# Altium footprint library SEMICONDUCTORS.PcbLib: 91 footprints (part 1 of 6)
Each footprint in its own frame and in the unit in brackets; x right, y up, seen from the top. Pads: shape width x height; smd on the part's side, far side on the other; paste and mask are expansions set on the pad; w line width, h text height; cw(c..) or ccw(c..) is an arc to the next point about the centre after c.
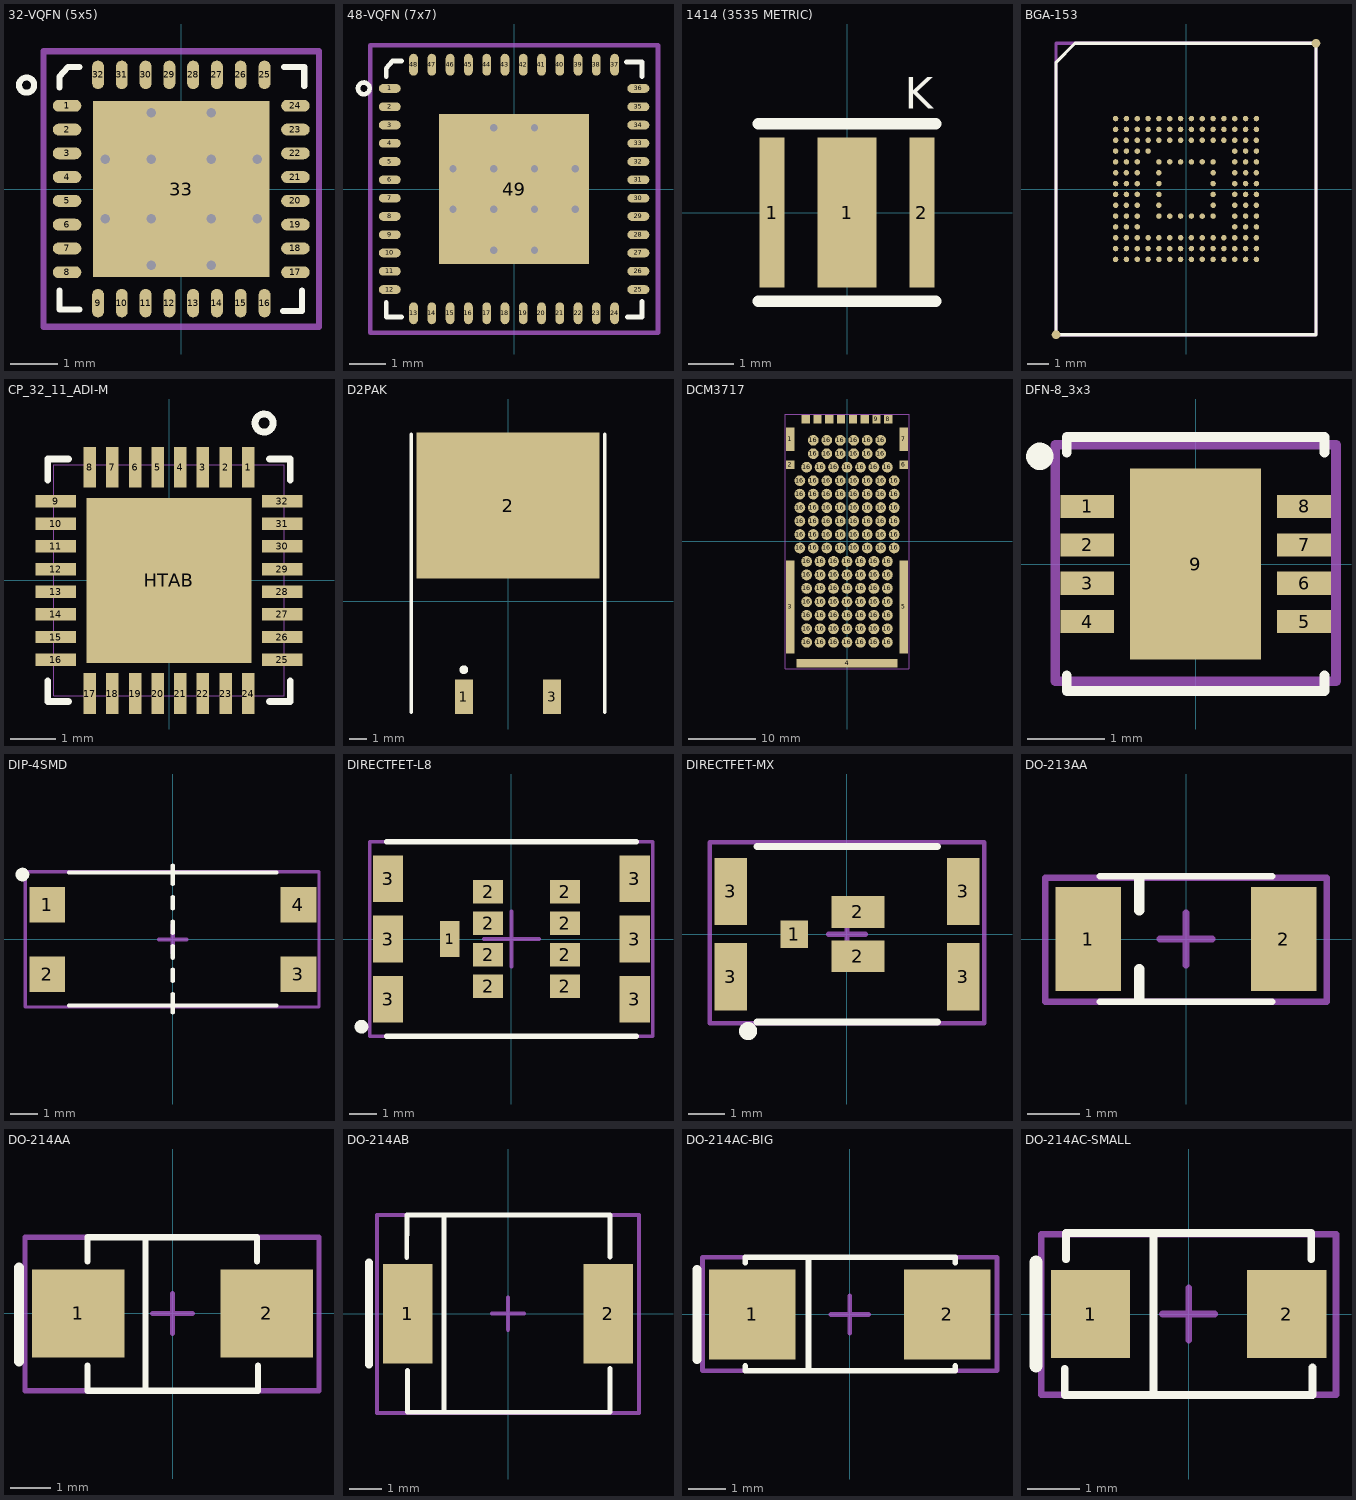
[diagram p0: the footprints below, top view; thin cyan lines are the x and y axes]

## 32-VQFN (5x5) [mm] "Stencil de espesor 5mil"
pads (33):
  oval 0.6x0.25 smd: 1(-2.4,1.75) 2(-2.4,1.25) 3(-2.4,0.75) 4(-2.4,0.25) 5(-2.4,-0.25) 6(-2.4,-0.75) 7(-2.4,-1.25) 8(-2.4,-1.75) 17(2.4,-1.75) 18(2.4,-1.25) 19(2.4,-0.75) 20(2.4,-0.25) 21(2.4,0.25) 22(2.4,0.75) 23(2.4,1.25) 24(2.4,1.75)
  oval 0.25x0.6 smd: 9(-1.75,-2.4) 10(-1.25,-2.4) 11(-0.75,-2.4) 12(-0.25,-2.4) 13(0.25,-2.4) 14(0.75,-2.4) 15(1.25,-2.4) 16(1.75,-2.4) 25(1.75,2.4) 26(1.25,2.4) 27(0.75,2.4) 28(0.25,2.4) 29(-0.25,2.4) 30(-0.75,2.4) 31(-1.25,2.4) 32(-1.75,2.4)
  rect 3.7x3.7 smd paste-1.32: 33(0,0)
via 1.6,0.63 diameter 0.3 hole 0.2
via 1.6,-0.63 diameter 0.3 hole 0.2
via -1.6,0.63 diameter 0.3 hole 0.2
via -1.6,-0.63 diameter 0.3 hole 0.2
via 0.63,-0.63 diameter 0.3 hole 0.2
via -0.63,-0.63 diameter 0.3 hole 0.2
via 0.63,0.63 diameter 0.3 hole 0.2
via -0.63,0.63 diameter 0.3 hole 0.2
via 0.63,-1.6 diameter 0.3 hole 0.2
via -0.63,-1.6 diameter 0.3 hole 0.2
via -0.63,1.6 diameter 0.3 hole 0.2
via 0.63,1.6 diameter 0.3 hole 0.2
Top Overlay:
  circle w0.127: c-3.251,2.184 r0.16
  lines w0.127: -2.56,-2.135 -2.56,-2.535 -2.135,-2.535 ; -2.56,2.135 -2.56,2.366 -2.385,2.56 -2.135,2.56 ; 2.135,-2.56 2.535,-2.56 2.535,-2.135 ; 2.161,2.561 2.586,2.561 2.586,2.161
Top Paste:
  region: 0.73,1.79 0.73,0.73 1.79,0.73 1.79,1.79
  region: 0.73,0.53 0.73,-0.53 1.79,-0.53 1.79,0.53
  region: 0.73,-0.73 0.73,-1.79 1.79,-1.79 1.79,-0.73
  region: -1.79,-0.73 -1.79,-1.79 -0.73,-1.79 -0.73,-0.73
  region: -1.79,0.53 -1.79,-0.53 -0.73,-0.53 -0.73,0.53
  region: -1.79,1.79 -1.79,0.73 -0.73,0.73 -0.73,1.79
  region: -0.53,-0.73 -0.53,-1.79 0.53,-1.79 0.53,-0.73
  region: -0.53,1.79 -0.53,0.73 0.53,0.73 0.53,1.79
Top Assembly (Mech8):
  lines w0.127: -2.896,-2.896 2.896,-2.896 2.896,2.896 -2.896,2.896 -2.896,-2.896
  text ".Designator" at -1.549,-0.381 h1.2
Top Component Center (Mech10):
  lines w0.15: -0.5,0 0.5,0 ; 0,-0.5 0,0.5
3D body "DS90UB953TRHBRQ1.STEP": height 1, standoff 0, extent -2.5,-2.5 2.5,2.5

## 48-VQFN (7x7) [mm] "Stencil de espesor 5mil"
pads (49):
  oval 0.6x0.24 smd: 1(-3.4,2.75) 2(-3.4,2.25) 3(-3.4,1.75) 4(-3.4,1.25) 5(-3.4,0.75) 6(-3.4,0.25) 7(-3.4,-0.25) 8(-3.4,-0.75) 9(-3.4,-1.25) 10(-3.4,-1.75) 11(-3.4,-2.25) 12(-3.4,-2.75) 25(3.4,-2.75) 26(3.4,-2.25) 27(3.4,-1.75) 28(3.4,-1.25) 29(3.4,-0.75) 30(3.4,-0.25) 31(3.4,0.25) 32(3.4,0.75) 33(3.4,1.25) 34(3.4,1.75) 35(3.4,2.25) 36(3.4,2.75)
  oval 0.24x0.6 smd: 13(-2.75,-3.4) 14(-2.25,-3.4) 15(-1.75,-3.4) 16(-1.25,-3.4) 17(-0.75,-3.4) 18(-0.25,-3.4) 19(0.25,-3.4) 20(0.75,-3.4) 21(1.25,-3.4) 22(1.75,-3.4) 23(2.25,-3.4) 24(2.75,-3.4) 37(2.75,3.4) 38(2.25,3.4) 39(1.75,3.4) 40(1.25,3.4) 41(0.75,3.4) 42(0.25,3.4) 43(-0.25,3.4) 44(-0.75,3.4) 45(-1.25,3.4) 46(-1.75,3.4) 47(-2.25,3.4) 48(-2.75,3.4)
  rect 4.1x4.1 smd paste-1.55: 49(0,0)
via 1.673,0.557 diameter 0.3 hole 0.2
via 1.673,-0.557 diameter 0.3 hole 0.2
via -1.673,0.557 diameter 0.3 hole 0.2
via -1.673,-0.557 diameter 0.3 hole 0.2
via 0.557,-0.557 diameter 0.3 hole 0.2
via -0.557,-0.557 diameter 0.3 hole 0.2
via 0.557,0.557 diameter 0.3 hole 0.2
via -0.557,0.557 diameter 0.3 hole 0.2
via 0.557,-1.673 diameter 0.3 hole 0.2
via -0.557,-1.673 diameter 0.3 hole 0.2
via -0.557,1.673 diameter 0.3 hole 0.2
via 0.557,1.673 diameter 0.3 hole 0.2
Top Overlay:
  circle w0.127: c-4.11,2.753 r0.16
  lines w0.127: -3.5,-3.1 -3.5,-3.5 -3.075,-3.5 ; -3.5,3.075 -3.5,3.306 -3.325,3.5 -3.075,3.5 ; 3.075,3.475 3.5,3.475 3.5,3.075 ; 3.1,-3.5 3.5,-3.5 3.5,-3.075
Top Paste:
  region: 0.615,1.615 0.615,0.615 1.615,0.615 1.615,1.615
  region: 0.615,0.5 0.615,-0.5 1.615,-0.5 1.615,0.5
  region: 0.615,-0.615 0.615,-1.615 1.615,-1.615 1.615,-0.615
  region: -1.615,-0.615 -1.615,-1.615 -0.615,-1.615 -0.615,-0.615
  region: -1.615,0.5 -1.615,-0.5 -0.615,-0.5 -0.615,0.5
  region: -1.615,1.615 -1.615,0.615 -0.615,0.615 -0.615,1.615
  region: -0.5,-0.615 -0.5,-1.615 0.5,-1.615 0.5,-0.615
  region: -0.5,1.615 -0.5,0.615 0.5,0.615 0.5,1.615
Top Assembly:
  lines w0.127: -3.937,-3.937 3.937,-3.937 3.937,3.937 -3.937,3.937 -3.937,-3.937
  text ".Designator" at -2.032,-0.508 h1.2
Top Component Center:
  lines w0.15: -0.5,0 0.5,0 ; 0,-0.5 0,0.5
3D body "DS90UB954TRGZTQ1.STEP": height 1, standoff 0, extent -3.5,-3.5 3.5,3.5

## 1414 (3535 METRIC) [mm] "LED XLAMP XP-E RED SMD"
height 3
pads (3):
  rect 0.55x3.3 smd paste-0.05 mask+0.04: 1(-1.65,0) 2(1.65,0)
  rect 1.3x3.3 smd paste-1 mask+0.04: 1(0.003,0)
Top Overlay:
  lines w0.254: -1.95,-1.95 1.95,-1.95 ; -1.95,1.95 1.95,1.95
  text "K" at 1.27,2.286 h0.7
Top Paste:
  rectangle: -0.505,0.15 0.505,1.5
  rectangle: -0.505,-1.5 0.505,-0.15
3D body: height 2.99, standoff 0.73, extent -1.518,-1.527 1.53,1.527
3D body: height 0.73, standoff 0, extent -2.032,-1.778 2.032,1.778

## BGA-153 [mm]
height 1.2
pads (155):
  round 0.25 smd mask+0.05: AA1(-3.25,-3.25) AA2(-2.75,-3.25) AA3(-2.25,-3.25) AA4(-1.75,-3.25) AA5(-1.25,-3.25) AA6(-0.75,-3.25) AA7(-0.25,-3.25) AA8(0.25,-3.25) AA9(0.75,-3.25) AA10(1.25,-3.25) AA11(1.75,-3.25) AA12(2.25,-3.25) AA13(2.75,-3.25) AA14(3.25,-3.25) H1(-3.25,3.25) H2(-2.75,3.25) H3(-2.25,3.25) H4(-1.75,3.25) H5(-1.25,3.25) H6(-0.75,3.25) H7(-0.25,3.25) H8(0.25,3.25) H9(0.75,3.25) H10(1.25,3.25) H11(1.75,3.25) H12(2.25,3.25) H13(2.75,3.25) H14(3.25,3.25) J1(-3.25,2.75) J2(-2.75,2.75) J3(-2.25,2.75) J4(-1.75,2.75) J5(-1.25,2.75) J6(-0.75,2.75) J7(-0.25,2.75) J8(0.25,2.75) J9(0.75,2.75) J10(1.25,2.75) J11(1.75,2.75) J12(2.25,2.75) J13(2.75,2.75) J14(3.25,2.75) K1(-3.25,2.25) K2(-2.75,2.25) K3(-2.25,2.25) K4(-1.75,2.25) K5(-1.25,2.25) K6(-0.75,2.25) K7(-0.25,2.25) K8(0.25,2.25) K9(0.75,2.25) K10(1.25,2.25) K11(1.75,2.25) K12(2.25,2.25) K13(2.75,2.25) K14(3.25,2.25) L1(-3.25,1.75) L2(-2.75,1.75) L3(-2.25,1.75) L4(-1.75,1.75) L12(2.25,1.75) L13(2.75,1.75) L14(3.25,1.75) M1(-3.25,1.25) M2(-2.75,1.25) M3(-2.25,1.25) M5(-1.25,1.25) M6(-0.75,1.25) M7(-0.25,1.25) M8(0.25,1.25) M9(0.75,1.25) M10(1.25,1.25) M12(2.25,1.25) M13(2.75,1.25) M14(3.25,1.25) N1(-3.25,0.75) N2(-2.75,0.75) N3(-2.25,0.75) N5(-1.25,0.75) N10(1.25,0.75) N12(2.25,0.75) N13(2.75,0.75) N14(3.25,0.75) P1(-3.25,0.25) P2(-2.75,0.25) P3(-2.25,0.25) P5(-1.25,0.25) P10(1.25,0.25) P12(2.25,0.25) P13(2.75,0.25) P14(3.25,0.25) R1(-3.25,-0.25) R2(-2.75,-0.25) R3(-2.25,-0.25) R5(-1.25,-0.25) R10(1.25,-0.25) R12(2.25,-0.25) R13(2.75,-0.25) R14(3.25,-0.25) T1(-3.25,-0.75) T2(-2.75,-0.75) T3(-2.25,-0.75) T5(-1.25,-0.75) T10(1.25,-0.75) T12(2.25,-0.75) T13(2.75,-0.75) T14(3.25,-0.75) U1(-3.25,-1.25) U2(-2.75,-1.25) U3(-2.25,-1.25) U5(-1.25,-1.25) U6(-0.75,-1.25) U7(-0.25,-1.25) U8(0.25,-1.25) U9(0.75,-1.25) U10(1.25,-1.25) U12(2.25,-1.25) U13(2.75,-1.25) U14(3.25,-1.25) V1(-3.25,-1.75) V2(-2.75,-1.75) V3(-2.25,-1.75) V12(2.25,-1.75) V13(2.75,-1.75) V14(3.25,-1.75) W1(-3.25,-2.25) W2(-2.75,-2.25) W3(-2.25,-2.25) W4(-1.75,-2.25) W5(-1.25,-2.25) W6(-0.75,-2.25) W7(-0.25,-2.25) W8(0.25,-2.25) W9(0.75,-2.25) W10(1.25,-2.25) W11(1.75,-2.25) W12(2.25,-2.25) W13(2.75,-2.25) W14(3.25,-2.25) Y1(-3.25,-2.75) Y2(-2.75,-2.75) Y3(-2.25,-2.75) Y4(-1.75,-2.75) Y5(-1.25,-2.75) Y6(-0.75,-2.75) Y7(-0.25,-2.75) Y8(0.25,-2.75) Y9(0.75,-2.75) Y10(1.25,-2.75) Y11(1.75,-2.75) Y12(2.25,-2.75) Y13(2.75,-2.75) Y14(3.25,-2.75)
  round 0.4 smd paste-0.4 mask+0.25: FID1(-6,-6.725) FID2(6,6.725)
Top Overlay:
  lines w0.15: -6,-6.725 -6,5.85 -5.125,6.725 6,6.725 6,-6.725 -6,-6.725
Top Assembly:
  lines w0.15: -6,-6.725 -6,6.725 6,6.725 6,-6.725 -6,-6.725
  text ".Designator" at -1.725,-0.745 h1.5
3D body: height 1.3, standoff 0.5, extent -5.298,5.601 -4.9,6
3D body: height 0.27, standoff -0.03, extent -1.891,1.602 -1.6,1.898
3D body: height 0.27, standoff -0.03, extent 1.114,-0.898 1.405,-0.602
3D body: height 0.27, standoff -0.03, extent 1.107,0.104 1.402,0.395
3D body: height 0.27, standoff -0.03, extent 1.107,-0.396 1.402,-0.105
3D body: height 0.27, standoff -0.03, extent 1.102,1.105 1.398,1.395
3D body: height 0.27, standoff -0.03, extent 1.102,0.605 1.398,0.895
3D body: height 0.27, standoff -0.03, extent 0.6,1.107 0.891,1.402
3D body: height 0.27, standoff -0.03, extent 0.1,1.107 0.391,1.402
3D body: height 0.27, standoff -0.03, extent -0.395,1.107 -0.105,1.402
3D body: height 0.27, standoff -0.03, extent -0.896,1.107 -0.605,1.402
3D body: height 0.27, standoff -0.03, extent -1.388,0.609 -1.093,0.9
3D body: height 0.27, standoff -0.03, extent -1.388,1.109 -1.093,1.4
3D body: height 0.27, standoff -0.03, extent -1.393,0.109 -1.098,0.4
3D body: height 0.27, standoff -0.03, extent -1.393,-0.391 -1.098,-0.1
3D body: height 0.27, standoff -0.03, extent -1.393,-0.891 -1.098,-0.6
3D body: height 0.27, standoff -0.03, extent 1.109,-1.398 1.4,-1.102
3D body: height 0.27, standoff -0.03, extent 0.609,-1.398 0.9,-1.102
3D body: height 0.27, standoff -0.03, extent 0.109,-1.398 0.4,-1.102
3D body: height 0.27, standoff -0.03, extent -0.386,-1.398 -0.095,-1.102
3D body: height 0.27, standoff -0.03, extent -0.886,-1.398 -0.595,-1.102
3D body: height 0.27, standoff -0.03, extent -1.386,-1.398 -1.095,-1.102
3D body: height 0.27, standoff -0.03, extent 3.109,-1.897 3.4,-1.602
3D body: height 0.27, standoff -0.03, extent 2.609,-1.897 2.9,-1.602
3D body: height 0.27, standoff -0.03, extent 2.109,-1.897 2.4,-1.602
3D body: height 0.27, standoff -0.03, extent 3.109,-1.397 3.4,-1.102
3D body: height 0.27, standoff -0.03, extent 2.609,-1.397 2.9,-1.102
3D body: height 0.27, standoff -0.03, extent 2.109,-1.397 2.4,-1.102
3D body: height 0.27, standoff -0.03, extent 3.109,-0.897 3.4,-0.602
3D body: height 0.27, standoff -0.03, extent 2.609,-0.897 2.9,-0.602
3D body: height 0.27, standoff -0.03, extent 2.109,-0.897 2.4,-0.602
3D body: height 0.27, standoff -0.03, extent 3.109,-0.398 3.4,-0.102
3D body: height 0.27, standoff -0.03, extent 2.609,-0.398 2.9,-0.102
3D body: height 0.27, standoff -0.03, extent 2.109,-0.398 2.4,-0.102
3D body: height 0.27, standoff -0.03, extent 3.109,0.103 3.4,0.398
3D body: height 0.27, standoff -0.03, extent 2.609,0.103 2.9,0.398
3D body: height 0.27, standoff -0.03, extent 2.109,0.103 2.4,0.398
3D body: height 0.27, standoff -0.03, extent 3.109,0.603 3.4,0.898
3D body: height 0.27, standoff -0.03, extent 2.609,0.603 2.9,0.898
3D body: height 0.27, standoff -0.03, extent 2.109,0.603 2.4,0.898
3D body: height 0.27, standoff -0.03, extent 3.119,1.103 3.409,1.398
3D body: height 0.27, standoff -0.03, extent 2.619,1.103 2.909,1.398
3D body: height 0.27, standoff -0.03, extent 2.119,1.103 2.409,1.398
3D body: height 0.27, standoff -0.03, extent 3.114,1.603 3.405,1.898
3D body: height 0.27, standoff -0.03, extent 2.614,1.603 2.905,1.898
3D body: height 0.27, standoff -0.03, extent 2.114,1.603 2.405,1.898
3D body: height 0.27, standoff -0.03, extent -2.391,1.602 -2.1,1.898
3D body: height 0.27, standoff -0.03, extent -2.891,1.602 -2.6,1.898
3D body: height 0.27, standoff -0.03, extent -3.391,1.602 -3.1,1.898
3D body: height 0.27, standoff -0.03, extent -2.391,1.102 -2.1,1.398
3D body: height 0.27, standoff -0.03, extent -2.891,1.102 -2.6,1.398
3D body: height 0.27, standoff -0.03, extent -3.391,1.102 -3.1,1.398
3D body: height 0.27, standoff -0.03, extent -2.391,0.602 -2.1,0.898
3D body: height 0.27, standoff -0.03, extent -2.891,0.602 -2.6,0.898
3D body: height 0.27, standoff -0.03, extent -3.391,0.602 -3.1,0.898
3D body: height 0.27, standoff -0.03, extent -2.391,0.102 -2.1,0.398
3D body: height 0.27, standoff -0.03, extent -2.891,0.102 -2.6,0.398
3D body: height 0.27, standoff -0.03, extent -3.391,0.102 -3.1,0.398
3D body: height 0.27, standoff -0.03, extent -2.391,-0.398 -2.1,-0.102
3D body: height 0.27, standoff -0.03, extent -2.891,-0.398 -2.6,-0.102
3D body: height 0.27, standoff -0.03, extent -3.391,-0.398 -3.1,-0.102
3D body: height 0.27, standoff -0.03, extent -2.391,-0.898 -2.1,-0.602
3D body: height 0.27, standoff -0.03, extent -2.891,-0.898 -2.6,-0.602
3D body: height 0.27, standoff -0.03, extent -3.391,-0.898 -3.1,-0.602
3D body: height 0.27, standoff -0.03, extent -2.391,-1.398 -2.1,-1.102
3D body: height 0.27, standoff -0.03, extent -2.891,-1.398 -2.6,-1.102
3D body: height 0.27, standoff -0.03, extent -3.391,-1.398 -3.1,-1.102
3D body: height 0.27, standoff -0.03, extent -2.391,-1.898 -2.1,-1.602
3D body: height 0.27, standoff -0.03, extent -2.891,-1.898 -2.6,-1.602
3D body: height 0.27, standoff -0.03, extent -3.391,-1.898 -3.1,-1.602
3D body: height 0.27, standoff -0.03, extent -3.391,-3.398 -3.1,-3.102
3D body: height 0.27, standoff -0.03, extent -2.891,-3.398 -2.6,-3.102
3D body: height 0.27, standoff -0.03, extent -2.391,-3.398 -2.1,-3.102
3D body: height 0.27, standoff -0.03, extent -0.891,-3.397 -0.6,-3.102
3D body: height 0.27, standoff -0.03, extent -1.391,-3.397 -1.1,-3.102
3D body: height 0.27, standoff -0.03, extent -1.891,-3.398 -1.6,-3.102
3D body: height 0.27, standoff -0.03, extent 0.609,-3.397 0.9,-3.102
3D body: height 0.27, standoff -0.03, extent 0.109,-3.397 0.4,-3.102
3D body: height 0.27, standoff -0.03, extent -0.391,-3.398 -0.1,-3.102
3D body: height 0.27, standoff -0.03, extent 2.109,-3.397 2.4,-3.102
3D body: height 0.27, standoff -0.03, extent 1.609,-3.397 1.9,-3.102
3D body: height 0.27, standoff -0.03, extent 1.109,-3.398 1.4,-3.102
3D body: height 0.27, standoff -0.03, extent 2.6,-3.398 2.891,-3.102
3D body: height 0.27, standoff -0.03, extent 3.1,-3.398 3.391,-3.102
3D body: height 0.27, standoff -0.03, extent -3.391,-2.898 -3.1,-2.602
3D body: height 0.27, standoff -0.03, extent -2.891,-2.898 -2.6,-2.602
3D body: height 0.27, standoff -0.03, extent -2.391,-2.898 -2.1,-2.602
3D body: height 0.27, standoff -0.03, extent -0.891,-2.897 -0.6,-2.602
3D body: height 0.27, standoff -0.03, extent -1.391,-2.897 -1.1,-2.602
3D body: height 0.27, standoff -0.03, extent -1.891,-2.898 -1.6,-2.602
3D body: height 0.27, standoff -0.03, extent 0.609,-2.897 0.9,-2.602
3D body: height 0.27, standoff -0.03, extent 0.109,-2.897 0.4,-2.602
3D body: height 0.27, standoff -0.03, extent -0.391,-2.898 -0.1,-2.602
3D body: height 0.27, standoff -0.03, extent 2.109,-2.897 2.4,-2.602
3D body: height 0.27, standoff -0.03, extent 1.609,-2.897 1.9,-2.602
3D body: height 0.27, standoff -0.03, extent 1.109,-2.898 1.4,-2.602
3D body: height 0.27, standoff -0.03, extent 2.6,-2.898 2.891,-2.602
3D body: height 0.27, standoff -0.03, extent 3.1,-2.898 3.391,-2.602
3D body: height 0.27, standoff -0.03, extent -3.391,-2.398 -3.1,-2.102
3D body: height 0.27, standoff -0.03, extent -2.891,-2.398 -2.6,-2.102
3D body: height 0.27, standoff -0.03, extent -2.391,-2.398 -2.1,-2.102
3D body: height 0.27, standoff -0.03, extent -0.891,-2.397 -0.6,-2.102
3D body: height 0.27, standoff -0.03, extent -1.391,-2.397 -1.1,-2.102
3D body: height 0.27, standoff -0.03, extent -1.891,-2.398 -1.6,-2.102
3D body: height 0.27, standoff -0.03, extent 0.609,-2.397 0.9,-2.102
3D body: height 0.27, standoff -0.03, extent 0.109,-2.397 0.4,-2.102
3D body: height 0.27, standoff -0.03, extent -0.391,-2.398 -0.1,-2.102
3D body: height 0.27, standoff -0.03, extent 2.109,-2.397 2.4,-2.102
3D body: height 0.27, standoff -0.03, extent 1.609,-2.397 1.9,-2.102
3D body: height 0.27, standoff -0.03, extent 1.109,-2.398 1.4,-2.102
3D body: height 0.27, standoff -0.03, extent 2.6,-2.398 2.891,-2.102
3D body: height 0.27, standoff -0.03, extent 3.1,-2.398 3.391,-2.102
3D body: height 0.27, standoff -0.03, extent -3.391,2.102 -3.1,2.398
3D body: height 0.27, standoff -0.03, extent -2.891,2.102 -2.6,2.398
3D body: height 0.27, standoff -0.03, extent -2.391,2.102 -2.1,2.398
3D body: height 0.27, standoff -0.03, extent -0.891,2.103 -0.6,2.398
3D body: height 0.27, standoff -0.03, extent -1.391,2.103 -1.1,2.398
3D body: height 0.27, standoff -0.03, extent -1.891,2.102 -1.6,2.398
3D body: height 0.27, standoff -0.03, extent 0.609,2.103 0.9,2.398
3D body: height 0.27, standoff -0.03, extent 0.109,2.103 0.4,2.398
3D body: height 0.27, standoff -0.03, extent -0.391,2.102 -0.1,2.398
3D body: height 0.27, standoff -0.03, extent 2.109,2.103 2.4,2.398
3D body: height 0.27, standoff -0.03, extent 1.609,2.103 1.9,2.398
3D body: height 0.27, standoff -0.03, extent 1.109,2.102 1.4,2.398
3D body: height 0.27, standoff -0.03, extent 2.6,2.102 2.891,2.398
3D body: height 0.27, standoff -0.03, extent 3.1,2.102 3.391,2.398
3D body: height 0.27, standoff -0.03, extent -3.391,2.602 -3.1,2.898
3D body: height 0.27, standoff -0.03, extent -2.891,2.602 -2.6,2.898
3D body: height 0.27, standoff -0.03, extent -2.391,2.602 -2.1,2.898
3D body: height 0.27, standoff -0.03, extent -0.891,2.603 -0.6,2.898
3D body: height 0.27, standoff -0.03, extent -1.391,2.603 -1.1,2.898
3D body: height 0.27, standoff -0.03, extent -1.891,2.602 -1.6,2.898
3D body: height 0.27, standoff -0.03, extent 0.609,2.603 0.9,2.898
3D body: height 0.27, standoff -0.03, extent 0.109,2.603 0.4,2.898
3D body: height 0.27, standoff -0.03, extent -0.391,2.602 -0.1,2.898
3D body: height 0.27, standoff -0.03, extent 2.109,2.603 2.4,2.898
3D body: height 0.27, standoff -0.03, extent 1.609,2.603 1.9,2.898
3D body: height 0.27, standoff -0.03, extent 1.109,2.602 1.4,2.898
3D body: height 0.27, standoff -0.03, extent 2.6,2.602 2.891,2.898
3D body: height 0.27, standoff -0.03, extent 3.1,2.602 3.391,2.898
3D body: height 0.27, standoff -0.03, extent 3.1,3.102 3.391,3.398
3D body: height 0.27, standoff -0.03, extent 2.6,3.102 2.891,3.398
3D body: height 0.27, standoff -0.03, extent 1.109,3.102 1.4,3.398
3D body: height 0.27, standoff -0.03, extent 1.609,3.102 1.9,3.398
3D body: height 0.27, standoff -0.03, extent 2.109,3.102 2.4,3.398
3D body: height 0.27, standoff -0.03, extent -0.391,3.102 -0.1,3.398
3D body: height 0.27, standoff -0.03, extent 0.109,3.102 0.4,3.398
3D body: height 0.27, standoff -0.03, extent 0.609,3.102 0.9,3.398
3D body: height 0.27, standoff -0.03, extent -1.891,3.102 -1.6,3.398
3D body: height 0.27, standoff -0.03, extent -1.391,3.102 -1.1,3.398
3D body: height 0.27, standoff -0.03, extent -0.891,3.102 -0.6,3.398
3D body: height 0.27, standoff -0.03, extent -2.391,3.102 -2.1,3.398
3D body: height 0.27, standoff -0.03, extent -2.891,3.102 -2.6,3.398
3D body: height 0.27, standoff -0.03, extent -3.391,3.102 -3.1,3.398
3D body: height 1.27, standoff 0.15, extent -5.75,-6.5 5.75,6.5

## CP_32_11_ADI-M [mm]
pads (33):
  rect 0.275x0.9 smd paste+0 mask+0: 1(1.75,2.5) 2(1.25,2.5) 3(0.75,2.5) 4(0.25,2.5) 5(-0.25,2.5) 6(-0.75,2.5) 7(-1.25,2.5) 8(-1.75,2.5) 17(-1.75,-2.5) 18(-1.25,-2.5) 19(-0.75,-2.5) 20(-0.25,-2.5) 21(0.25,-2.5) 22(0.75,-2.5) 23(1.25,-2.5) 24(1.75,-2.5)
  rect 0.9x0.275 smd paste+0 mask+0: 9(-2.5,1.75) 10(-2.5,1.25) 11(-2.5,0.75) 12(-2.5,0.25) 13(-2.5,-0.25) 14(-2.5,-0.75) 15(-2.5,-1.25) 16(-2.5,-1.75) 25(2.5,-1.75) 26(2.5,-1.25) 27(2.5,-0.75) 28(2.5,-0.25) 29(2.5,0.25) 30(2.5,0.75) 31(2.5,1.25) 32(2.5,1.75)
  rect 3.65x3.65 smd paste+0 mask+0: HTAB(0,0)
Top Overlay:
  circle w0.152: c2.1,3.475 r0.2
  lines w0.152: -2.677,-2.22 -2.677,-2.677 -2.22,-2.677 ; -2.677,2.22 -2.677,2.677 -2.22,2.677 ; 2.22,-2.677 2.677,-2.677 2.677,-2.22 ; 2.22,2.677 2.677,2.677 2.677,2.22
Top Paste:
  region: -0.1,1.725 -1.725,1.725 -1.725,0.1 -0.1,0.1
  region: -0.1,-0.1 -1.725,-0.1 -1.725,-1.725 -0.1,-1.725
  region: 1.725,1.725 0.1,1.725 0.1,0.1 1.725,0.1
  region: 1.725,-0.1 0.1,-0.1 0.1,-1.725 1.725,-1.725
Mechanical 13:
  lines w0.025: -2.55,-2.55 2.55,-2.55 2.55,2.55 -2.55,2.55 -2.55,-2.55 ; -2.55,-1.9 -2.55,-1.6 -2.55,-1.9 ; -2.55,-1.4 -2.55,-1.1 -2.55,-1.4 ; -2.55,-0.9 -2.55,-0.6 -2.55,-0.9 ; -2.55,-0.4 -2.55,-0.1 -2.55,-0.4 ; -2.55,0.1 -2.55,0.4 -2.55,0.1 ; -2.55,0.6 -2.55,0.9 -2.55,0.6 ; -2.55,1.1 -2.55,1.4 -2.55,1.1 ; -2.55,1.6 -2.55,1.9 -2.55,1.6 ; -1.9,-2.55 -1.6,-2.55 -1.9,-2.55 ; -1.9,2.55 -1.6,2.55 -1.9,2.55 ; -1.4,-2.55 -1.1,-2.55 -1.4,-2.55 ; -1.4,2.55 -1.1,2.55 -1.4,2.55 ; -0.9,-2.55 -0.6,-2.55 -0.9,-2.55 ; -0.9,2.55 -0.6,2.55 -0.9,2.55 ; -0.4,-2.55 -0.1,-2.55 -0.4,-2.55 ; -0.4,2.55 -0.1,2.55 -0.4,2.55 ; 0.1,-2.55 0.4,-2.55 0.1,-2.55 ; 0.1,2.55 0.4,2.55 0.1,2.55 ; 0.6,-2.55 0.9,-2.55 0.6,-2.55 ; 0.6,2.55 0.9,2.55 0.6,2.55 ; 1.1,-2.55 1.4,-2.55 1.1,-2.55 ; 1.1,2.55 1.4,2.55 1.1,2.55 ; 1.6,-2.55 1.9,-2.55 1.6,-2.55 ; 1.6,2.55 1.9,2.55 1.6,2.55 ; 2.55,-1.9 2.55,-1.6 2.55,-1.9 ; 2.55,-1.4 2.55,-1.1 2.55,-1.4 ; 2.55,-0.9 2.55,-0.6 2.55,-0.9 ; 2.55,-0.4 2.55,-0.1 2.55,-0.4 ; 2.55,0.1 2.55,0.4 2.55,0.1 ; 2.55,0.6 2.55,0.9 2.55,0.6 ; 2.55,1.1 2.55,1.4 2.55,1.1 ; 2.55,1.6 2.55,1.9 2.55,1.6
3D body "CP_32_11_ADI.step": height 0.8, standoff 0, extent -2.55,-2.55 2.55,2.55

## D2PAK [mm] "D2-PAK/TO-263-AB; 3 Leads (1 Cropped); Body 15.5 (inc. leads) x 10.5 mm (LxW max)"
height 4.69
pads (3):
  rect 1.05x2 smd: 1(-2.54,-5.5) 3(2.54,-5.5)
  rect 10.55x8.4 smd: 2(0,5.5)
Top Overlay:
  circle w0.25: c-2.54,-3.95 r0.125
  lines w0.2: -5.575,-6.4 -5.575,9.6 ; 5.575,-6.4 5.575,9.6
3D body: height 4.9, standoff 0, extent -5.334,-1.397 5.334,9.271

## DCM3717 [mm]
pads (131):
  rect 1.23x3.47 smd: 1(-8.445,15.14) 7(8.445,15.14)
  rect 1.23x1.24 smd: 2(-8.445,11.35) 6(8.445,11.35)
  rect 1.23x13.8 smd: 3(-8.445,-9.76) 5(8.445,-9.76)
  rect 15.04x1.24 smd: 4(0,-18.135)
  rect 1.23x1.23 smd: 8(6.13,18.135) 9(4.38,18.135) 10(2.63,18.135) 11(0.88,18.135) 12(-0.88,18.135) 13(-2.63,18.135) 14(-4.38,18.135) 15(-6.13,18.135)
  round 1.6 smd mask+0.05: 16(-7,-1) 16(-7,1) 16(-7,3) 16(-7,5) 16(-7,7) 16(-7,9) 16(-6,-15) 16(-6,-13) 16(-6,-11) 16(-6,-9) 16(-6,-7) 16(-6,-5) 16(-6,-3) 16(-6,11) 16(-5,-1) 16(-5,1) 16(-5,3) 16(-5,5) 16(-5,7) 16(-5,9) 16(-5,13) 16(-5,15) 16(-4,-13) 16(-4,-11) 16(-4,-9) 16(-4,-7) 16(-4,-5) 16(-4,-3) 16(-4,11) 16(-4,-15) 16(-3,-1) 16(-3,1) 16(-3,3) 16(-3,5) 16(-3,7) 16(-3,9) 16(-3,13) 16(-3,15) 16(-2,-15) 16(-2,-13) 16(-2,-11) 16(-2,-9) 16(-2,-7) 16(-2,-5) 16(-2,-3) 16(-2,11) 16(-1,-1) 16(-1,1) 16(-1,3) 16(-1,5) 16(-1,7) 16(-1,9) 16(-1,13) 16(-1,15) 16(0,-15) 16(0,-13) 16(0,-11) 16(0,-9) 16(0,-7) 16(0,-5) 16(0,-3) 16(0,11) 16(1,-1) 16(1,1) 16(1,3) 16(1,5) 16(1,7) 16(1,9) 16(1,13) 16(1,15) 16(2,-15) 16(2,-13) 16(2,-11) 16(2,-9) 16(2,-7) 16(2,-5) 16(2,-3) 16(2,11) 16(3,-1) 16(3,1) 16(3,3) 16(3,5) 16(3,7) 16(3,9) 16(3,13) 16(3,15) 16(4,-15) 16(4,-13) 16(4,-11) 16(4,-9) 16(4,-7) 16(4,-5) 16(4,-3) 16(4,11) 16(5,-1) 16(5,1) 16(5,3) 16(5,5) 16(5,7) 16(5,9) 16(5,13) 16(5,15) 16(6,-15) 16(6,-13) 16(6,-11) 16(6,-9) 16(6,-7) 16(6,-5) 16(6,-3) 16(6,11) 16(7,-1) 16(7,1) 16(7,3) 16(7,5) 16(7,7) 16(7,9)
Top Assembly:
  lines w0.127: -9.175,-18.925 9.175,-18.925 9.175,18.9 -9.175,18.9 -9.175,-18.925
  text ".Designator" at -3.875,-0.775 h2
3D body "DCM3717.STEP": height 7.42, standoff 0, extent -8.675,-18.355 8.662,18.355

## DFN-8_3x3 [mm]
pads (9):
  rect 0.7x0.3 smd: 1(-1.41,0.75) 2(-1.41,0.25) 3(-1.41,-0.25) 4(-1.41,-0.75) 5(1.41,-0.75) 6(1.41,-0.25) 7(1.41,0.25) 8(1.41,0.75)
  rect 1.7x2.489 smd paste-1: 9(0,0)
Top Overlay:
  circle w0.254: c-2.025,1.4 r0.05
  lines w0.127: -1.677,-1.448 -1.677,-1.651 1.676,-1.651 1.676,-1.448 ; -1.677,1.448 -1.677,1.652 1.676,1.652 1.676,1.448
Top Paste:
  region: 0.101,-0.1 0.1,-1.125 0.775,-1.125 0.775,-0.1
  region: -0.775,-0.1 -0.775,-1.125 -0.1,-1.125 -0.1,-0.1
  region: 0.1,1.125 0.1,0.1 0.775,0.1 0.775,1.125
  region: -0.775,1.125 -0.775,0.1 -0.1,0.1 -0.1,1.125
Top Assembly:
  lines w0.127: -1.825,-1.525 -1.825,1.55 1.825,1.55 1.825,-1.525 -1.825,-1.525
  text ".Designator" at -1.05,-0.375 h1
Top Component Center:
  lines w0.15: -0.5,0 0.5,0 ; 0,-0.5 0,0.5
3D body: height 0.82, standoff 0.01, extent -1.199,1.025 -1,1.225
3D body: height 0.25, standoff 0, extent 1.324,-0.4 1.525,-0.1
3D body: height 0.25, standoff 0, extent 1.324,-0.9 1.525,-0.6
3D body: height 0.25, standoff 0, extent 1.324,0.1 1.525,0.4
3D body: height 0.25, standoff 0, extent 1.324,0.6 1.525,0.9
3D body: height 0.25, standoff 0, extent -1.525,0.6 -1.324,0.9
3D body: height 0.25, standoff 0, extent -1.526,-0.4 -1.325,-0.1
3D body: height 0.25, standoff 0, extent -1.526,0.1 -1.325,0.4
3D body: height 0.25, standoff 0, extent -1.526,-0.9 -1.325,-0.6
3D body: height 0.8, standoff 0, extent -1.5,-1.5 1.5,1.5

## DIP-4SMD [mm]
pads (4):
  rect 1.3x1.3 smd: 1(-4.6,1.27) 2(-4.6,-1.27) 3(4.6,-1.27) 4(4.6,1.27)
Top Overlay:
  circle w0.25: c-5.5,2.37 r0.125
  lines w0.15: -3.8,-2.425 3.8,-2.425 ; -3.8,2.45 3.8,2.45 ; 0,-2.675 0,-2 ; 0,-1.525 0,-1.1 ; 0,-0.675 0,-0.25 ; 0,0.225 0,0.65 ; 0,1.125 0,1.55 ; 0,2.025 0,2.7
Top Assembly:
  lines w0.127: -5.4,-2.475 5.35,-2.475 5.35,2.475 -5.4,2.475 -5.4,-2.475
  text ".Designator" at -2.125,-0.5 h1.2
Top Component Center:
  lines w0.15: -0.5,0 0.5,0 ; 0,-0.5 0,0.5
3D body "DIP-4SMD.step": height 3.88, standoff -0.02, extent -5.015,-2.416 5.015,2.416

## DIRECTFET-L8 [mm]
height 0.6
pads (15):
  rect 0.7x1.3 smd: 1(-2.25,0)
  rect 1.1x0.85 smd: 2(-0.85,-1.725) 2(-0.85,-0.575) 2(-0.85,0.575) 2(-0.85,1.725) 2(1.95,-1.725) 2(1.95,-0.575) 2(1.95,0.575) 2(1.95,1.725)
  rect 1.1x1.7 smd: 3(-4.5,-2.2) 3(-4.5,0) 3(-4.5,2.2) 3(4.5,-2.2) 3(4.5,0) 3(4.5,2.2)
Top Overlay:
  circle w0.25: c-5.474,-3.2 r0.125
  lines w0.2: -4.55,-3.55 4.55,-3.55 ; -4.55,3.55 4.55,3.55
Top Assembly:
  lines w0.127: -5.175,-3.55 -5.175,3.55 5.15,3.55 5.15,-3.55 -5.175,-3.55
  text ".Designator" at -2.225,-0.75 h1.5
Top Component Center:
  lines w0.15: -1,0 1,0 ; 0,-1 0,1
3D body "DIRECTFET-L8.STEP": height 0.67, standoff -0.07, extent -4.55,-3.487 4.55,3.488

## DIRECTFET-MX [mm]
height 0.6
pads (7):
  rect 0.75x0.75 smd: 1(-1.45,0)
  rect 1.45x0.87 smd: 2(0.3,-0.61) 2(0.3,0.61)
  rect 0.9x1.85 smd: 3(-3.2,-1.175) 3(-3.2,1.175) 3(3.2,-1.175) 3(3.2,1.175)
Top Overlay:
  circle w0.25: c-2.72,-2.667 r0.125
  lines w0.2: -2.466,-2.413 2.487,-2.413 ; -2.466,2.413 2.487,2.413
Top Assembly:
  lines w0.127: -3.775,-2.45 -3.775,2.525 3.775,2.525 3.775,-2.45 -3.775,-2.45
  text ".Designator" at -1.7,-0.475 h1.2
Top Component Center:
  lines w0.15: -0.5,0 0.5,0 ; 0,-0.5 0,0.5
3D body "DIRECTFET-MX.stp": height 0.65, standoff 0, extent -3.15,-2.462 3.15,2.463

## DO-213AA [mm]
pads (2):
  rect 1.25x2 smd: 1(-1.875,0) 2(1.875,0)
Top Overlay:
  lines w0.127: -1.65,-1.2 1.65,-1.2 ; -1.65,1.2 1.65,1.2
  lines w0.2: -0.9,-1.125 -0.9,-0.575 ; -0.9,0.55 -0.9,1.15
Top Assembly:
  lines w0.127: -2.7,-1.2 -2.7,1.175 2.7,1.175 2.7,-1.2 -2.7,-1.2
  text ".Designator" at -1.85,-0.525 h1.2
Top Component Center:
  lines w0.127: -0.5,0 0.5,0 ; 0,-0.5 0,0.5
3D body: height 1.59, standoff 0, extent -0.85,-0.798 -0.35,0.798
3D body: height 1.6, standoff -0.01, extent 1.225,-0.808 1.725,0.808
3D body: height 1.6, standoff -0.01, extent -1.725,-0.808 -1.225,0.808
3D body: height 1.56, standoff 0.01, extent -1.5,-0.778 1.5,0.779

## DO-214AA [mm]
pads (2):
  rect 2.3x2.2 smd: 1(-2.35,0) 2(2.35,0)
Top Overlay:
  lines w0.15: -2.114,-1.3 -2.114,-1.925 2.125,-1.925 2.125,-1.3 ; -2.114,1.3 -2.114,1.9 2.1,1.9 2.1,1.3 ; -0.675,-1.925 -0.675,1.875
  lines w0.25: -3.825,-1.2 -3.825,1.15
Top Assembly:
  lines w0.127: -3.675,-1.925 -3.675,1.9 3.65,1.9 3.65,-1.925 -3.675,-1.925
  text ".Designator" at -2.2,-0.5 h1.2
Top Component Center:
  lines w0.127: -0.5,0 0.5,0 ; 0,-0.5 0,0.5
3D body "DO-214AA.STEP": height 2.61, standoff -0.01, extent -2.699,-1.81 2.699,1.81

## DO-214AB [mm]
pads (2):
  rect 1.52x3.07 smd: 1(-3.1,0) 2(3.1,0)
Top Overlay:
  lines w0.15: -3.128,1.725 -3.116,3.05 3.15,3.05 3.15,1.75 ; -3.1,-1.75 -3.1,-3.05 3.15,-3.05 3.15,-2.8 3.15,-1.7 ; -1.975,-3 -1.975,3.025
  lines w0.25: -4.3,-1.575 -4.3,1.575
Top Assembly:
  lines w0.127: -4.05,-3.075 4.05,-3.075 4.05,3.05 -4.05,3.05 -4.05,-3.075
  text ".Designator" at -2.5,-0.5 h1.2
Top Component Center:
  lines w0.127: -0.5,0 0.5,0 ; 0,-0.5 0,0.5
3D body "DO-214AB.STEP": height 2.58, standoff -0.04, extent -3.97,-2.952 3.97,2.953

## DO-214AC-BIG [mm] "Manufacturer: BOURNS"
pads (2):
  rect 2.3x2.4 smd: 1(-2.6,0) 2(2.6,0)
Top Overlay:
  lines w0.15: -2.789,-1.375 -2.789,-1.5 2.811,-1.5 2.811,-1.375 ; -2.789,1.375 -2.789,1.525 2.811,1.525 2.811,1.375 ; -1.1,-1.45 -1.1,1.5
  lines w0.25: -4.075,-1.2 -4.075,1.2
Top Assembly:
  lines w0.127: -3.925,-1.5 3.925,-1.5 3.925,1.525 -3.925,1.525 -3.925,-1.5
  text ".Designator" at -2.85,-0.45 h1.2
Top Component Center:
  lines w0.127: -0.5,0 0.5,0 ; 0,-0.5 0,0.5
3D body: height 0.25, standoff 0, extent 2.825,2.775 2.825,2.775
3D body: height 0.25, standoff 0, extent 0.85,2.5 0.85,2.5
3D body "DO-214AC.step": height 2.4, standoff 0, extent -2.6,-1.3 2.6,1.3

## DO-214AC-SMALL [mm] "Manufacturer: Vishay"
pads (2):
  rect 1.52x1.68 smd: 1(-1.88,0) 2(1.88,0)
Top Overlay:
  lines w0.15: -2.375,-1.05 -2.375,-1.55 2.375,-1.55 2.375,-1.025 ; -2.35,1.05 -2.35,1.55 2.35,1.55 2.35,1.05 ; -0.675,-1.5 -0.675,1.5
  lines w0.25: -2.925,-1 -2.925,1
Top Assembly:
  lines w0.127: -2.825,-1.55 2.825,-1.55 2.825,1.525 -2.825,1.525 -2.825,-1.55
  text ".Designator" at -2.4,-0.5 h1.2
Top Component Center:
  lines w0.127: -0.5,0 0.5,0 ; 0,-0.5 0,0.5
3D body "DO-214AC.step": height 2.4, standoff 0, extent -2.6,-1.3 2.6,1.3